# Altium footprint library Apalis Evaluation Board.PcbLib: 212 footprints (part 1 of 14)
Each footprint in its own frame and in the unit in brackets; x right, y up, seen from the top. Pads: shape width x height; smd on the part's side, far side on the other; paste and mask are expansions set on the pad; w line width, h text height; cw(c..) or ccw(c..) is an arc to the next point about the centre after c.
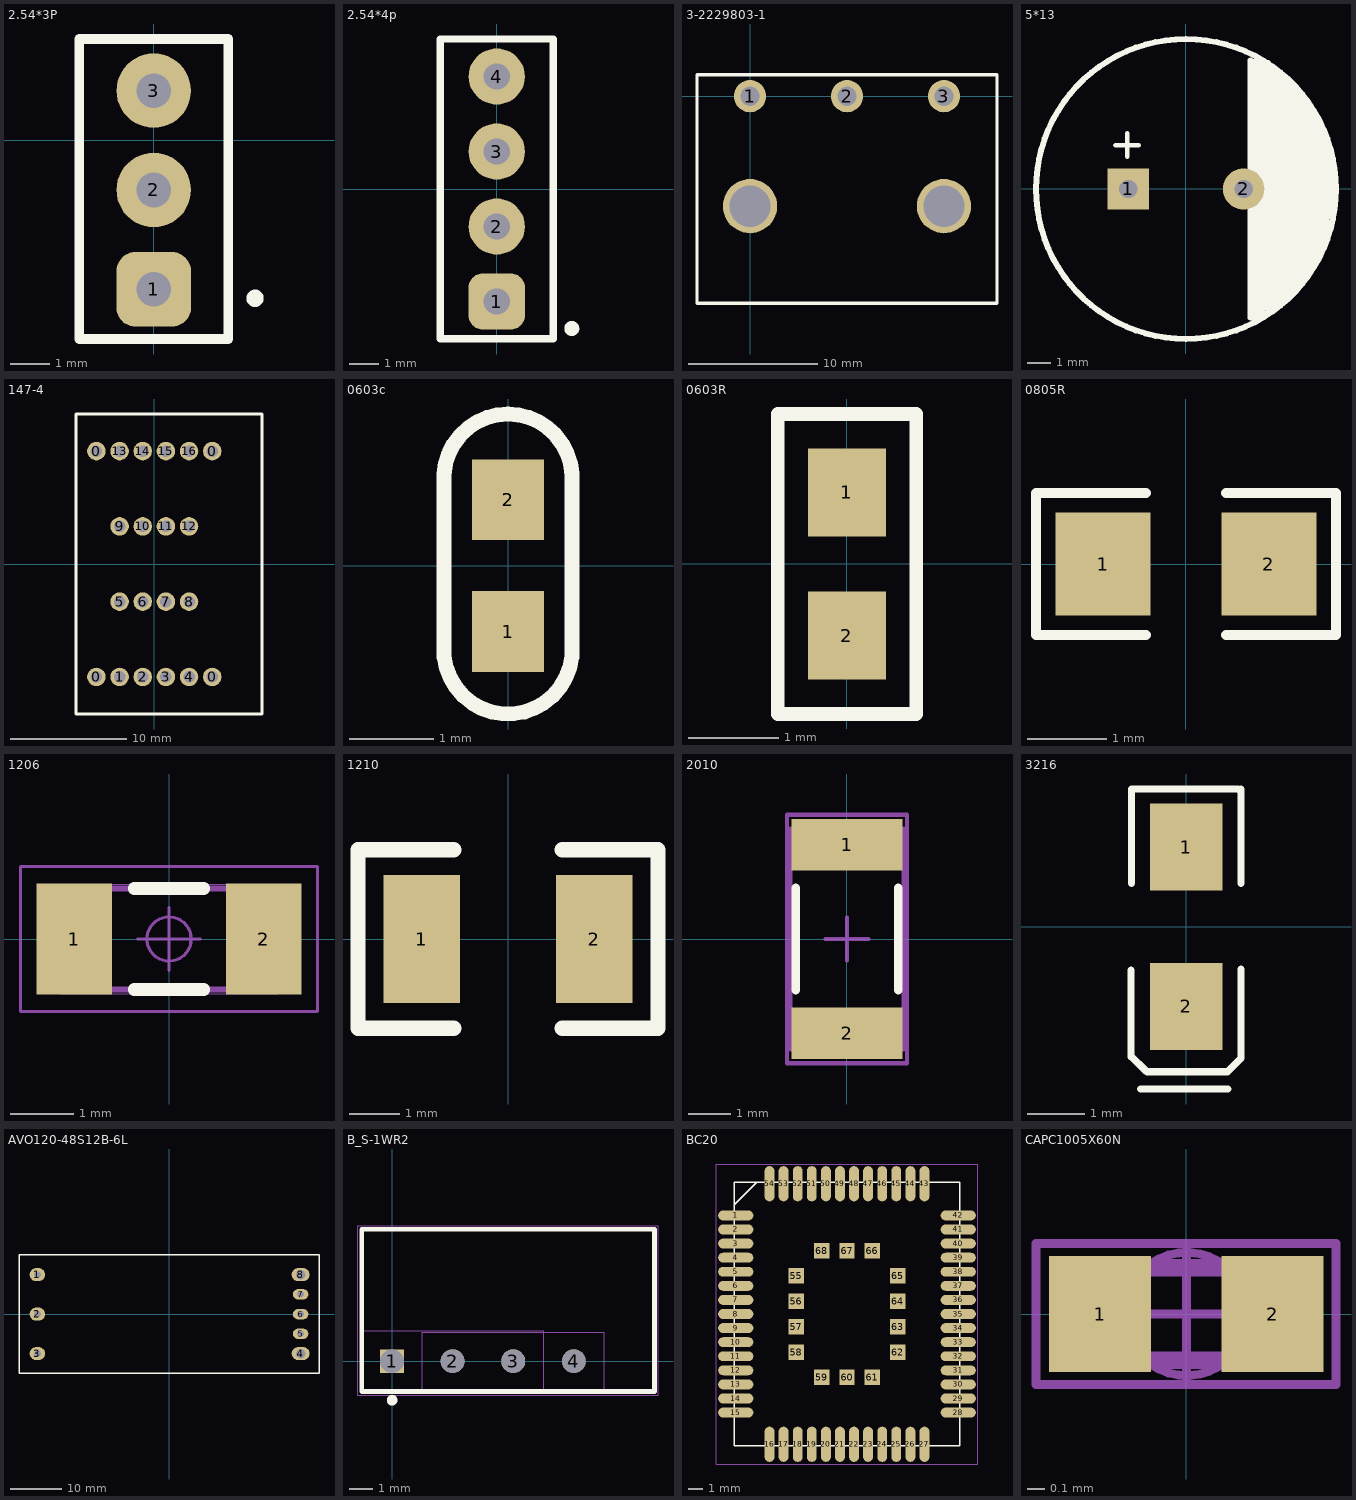
[diagram p0: the footprints below, top view; thin cyan lines are the x and y axes]

## 2.54*3P [mil]
pads (3):
  rrect50% 75x75 hole 35 paste+0: 1(0,-150)
  round 75 hole 35 paste+0: 2(0,-50) 3(0,50)
Top Overlay:
  circle w10: c102,-159 r3.74
  lines w10: -75,-200 -75,102 -37.5,102 37.5,102 75,102 75,-200 -75,-200

## 2.54*4p [mil]
pads (4):
  rrect50% 75x75 hole 35 paste+0: 1(0,-150)
  round 75 hole 35 paste+0: 2(0,-50) 3(0,50) 4(0,150)
Top Overlay:
  circle w10: c100,-186 r5
  lines w10: -75,-200 75,-200 75,200 -75,200 -75,-200

## 3-2229803-1 [mm] "泰科电源端子座"
pads (5):
  round 2.5 hole 1.5: 1(0,0) 2(7.5,0) 3(15,0)
  round 4.2 hole 3.2: ""(0,-8.5) ""(15,-8.5)
Top Overlay:
  lines w0.254: -4.1,-15.998 -4.1,1.651 19.1,1.651 19.1,-16.002 19.098,-16 0,-16 -4.098,-16 -4.1,-15.998

## 5*13 [mm]
pads (2):
  rect 1.8x1.8 hole 0.8: 1(-2.5,0)
  round 1.8 hole 0.8: 2(2.5,0)
Top Overlay:
  circle w0.254: c0,0 r6.51
  lines w0.2: -3.059,1.905 -2.043,1.905 ; -2.551,1.397 -2.551,2.413
  lines w0.254: 3.937,-4.953 3.937,-4.699 3.937,4.953 ; 4.318,-4.826 4.318,4.572 ; 4.318,-4.445 4.699,-4.445 ; 4.572,-4.445 4.572,4.445 ; 4.826,-4.318 4.826,4.191 ; 4.826,-3.81 4.826,-3.683 5.08,-3.429 5.842,-2.667 5.842,-2.54 5.842,2.54 ; 4.953,-3.937 4.953,-3.81 ; 5.08,4.064 5.08,-3.683 ; 5.334,-3.556 5.334,3.556 ; 6.096,-1.778 6.096,1.905 ; 6.096,-1.397 6.096,-1.27 ; 6.096,-1.143 6.096,1.27 ; 6.35,1.397 6.35,-1.016 6.096,-1.27 ; 2.794,-5.588 2.794,5.588 ; 2.794,-5.588 3.048,-5.334 ; 2.794,-5.588 3.048,-5.588 3.175,-5.461 ; 2.794,-5.588 2.921,-5.588 3.048,-5.461 3.175,-5.461 ; 2.794,-5.588 2.921,-5.461 2.794,-5.588 ; 2.794,-5.588 3.048,-5.334 ; 2.794,5.588 3.048,5.334 ; 2.794,5.588 3.048,5.334 ; 2.794,5.588 6.096,2.286 ; 3.048,-5.334 3.048,5.334 ; 3.048,-5.334 3.048,5.588 3.302,5.334 3.302,-5.334 3.175,-5.461 ; 3.048,5.334 3.175,5.461 3.556,5.461 5.334,3.683 ; 3.175,-5.461 3.429,-5.461 3.683,-5.207 3.556,-5.207 3.556,5.334 3.81,5.08 3.81,-5.08 4.191,-4.699 ; 4.191,-4.699 4.191,4.826 4.191,-4.699 ; 4.318,4.572 4.318,4.318 5.588,3.048 ; 4.318,4.572 4.445,4.572 5.334,3.683 ; 4.953,-3.81 5.08,-3.683 ; 4.953,-3.81 4.953,-3.683 5.588,-3.048 ; 5.08,-3.683 5.08,-3.175 6.096,-2.159 6.096,2.286 ; 5.08,-3.683 5.334,-3.429 5.334,-3.302 5.588,-3.048 ; 5.334,3.556 5.334,3.683 ; 5.334,3.556 5.334,3.683 ; 5.588,-3.048 5.588,3.048 ; 5.588,3.048 5.588,2.794 6.096,2.286 ; 6.096,-1.27 6.096,2.286

## 147-4 [mm]
pads (20):
  round 1.6 hole 1: 0(-5,-9.75) 0(-5,9.75) 0(5,-9.75) 0(5,9.75) 1(-3,-9.75) 2(-1,-9.75) 3(1,-9.75) 4(3,-9.75) 5(-3,-3.25) 6(-1,-3.25) 7(1,-3.25) 8(3,-3.25) 9(-3,3.25) 10(-1,3.25) 11(1,3.25) 12(3,3.25) 13(-3,9.75) 14(-1,9.75) 15(1,9.75) 16(3,9.75)
Top Overlay:
  lines w0.254: -6.75,-12.95 7.05,-12.95 ; -6.75,-12.89 -6.75,-11.528 -6.75,12.95 7.05,12.95 9.283,12.95 9.287,12.954 9.287,-12.946 9.283,-12.95 7.033,-12.95 7.05,-12.933

## 0603c [mil]
pads (2):
  rect 34x38 smd: 1(0,-31) 2(0,31)
Top Overlay:
  lines w7: -30,-43.03 ccw(c0,-39.5) 30,-42.97 ; -30,-43 -30,0 ; -30,-5 -30,38 ; -30,37.97 cw(c0,41.13) 30,38.03 ; 30,-43 30,0 ; 30,-5 30,38

## 0603R [mil]
pads (2):
  rect 34x38 smd: 1(0,31) 2(0,-31)
Top Overlay:
  lines w6: -30,-65 -30,0 -30,65 30,65 30,0 30,-65 -30,-65

## 0805R [mm]
pads (2):
  rect 1.2x1.3 smd: 1(-1.05,0) 2(1.05,0)
Top Overlay:
  lines w0.127: -0.508,-0.9 -1.9,-0.9 -1.9,0.9 -0.508,0.9 ; 0.508,-0.9 1.9,-0.9 1.9,0.9 0.508,0.9

## 1206 [mm] "1206R"
height 0.6
pads (2):
  rect 1.2x1.75 smd: 1(-1.5,0) 2(1.5,0)
Top Overlay:
  lines w0.2: -0.55,-0.8 0.55,-0.8 ; -0.55,0.8 0.55,0.8
Mechanical 1:
  circle w0.05: c0,0 r0.35
  lines w0.05: -0.5,0 0.5,0 ; 0,-0.5 0,0.5 ; -2.35,-1.15 -2.35,1.15 2.35,1.15 2.35,-1.15 -2.35,-1.15
Mechanical 2:
  lines w0.001: -1.725,-0.865 -1.725,0.865 1.725,0.865 1.725,-0.865 -1.725,-0.865
Mechanical 3:
  lines w0.1: -1.63,-0.8 -1.63,0.8 1.63,0.8 1.63,-0.8 -1.63,-0.8
3D body: height 0.6, standoff 0, extent -1.725,-0.865 1.725,0.865

## 1210 [mil]
pads (2):
  rect 60x100 smd: 1(-67.5,0) 2(67.5,0)
Top Overlay:
  lines w12: -42.5,-70 -117.5,-70 -117.5,70 -42.5,70 ; 42.5,-70 117.5,-70 117.5,70 42.5,70

## 2010 [mm]
pads (2):
  rect 2.6x1.2 smd: 1(0,2.2) 2(0,-2.2)
Top Overlay:
  lines w0.2: -1.2,-1.2 -1.2,1.2 ; 1.2,-1.2 1.2,1.2
Mechanical 13:
  lines w0.1: -1.325,-2.575 1.325,-2.575 1.325,2.575 -1.325,2.575 -1.325,-2.575
Mechanical 15:
  lines w0.1: -0.5,0 0.5,0 ; 0,-0.5 0,0.5 ; -1.4,-2.9 1.4,-2.9 1.4,2.9 -1.4,2.9 -1.4,-2.9

## 3216 [mil]
pads (2):
  rect 50x60 smd: 1(0,55) 2(0,-55)
Top Overlay:
  lines w5: -38.23,-89.45 -27.95,-99.33 ; -38.19,-89.88 -38.19,-29.88 ; -37.8,29.8 -37.8,95.03 35.8,95.03 37.8,93.03 37.8,88.03 ; -31.47,-111.97 28.53,-111.97 ; -27.16,-100.12 28.35,-100.12 ; 29.13,-99.33 37.8,-90.67 ; 37.8,-89.09 37.8,-29.09 ; 37.8,29.8 37.8,95.03

## AVO120-48S12B-6L [mm]
pads (8):
  oval 3x2.5 hole 1.3: 1(-25.4,7.62) 2(-25.4,0) 3(-25.4,-7.62)
  oval 3.5x2.5 hole 1.8: 4(25.4,-7.62) 8(25.4,7.62)
  oval 3x2 hole 1.3: 5(25.4,-3.81) 6(25.4,0) 7(25.4,3.81)
Top Overlay:
  lines w0.254: -28.95,-11.436 -28.95,7.62 -28.95,11.43 ; -28.934,-11.42 -27.93,-11.42 5.07,-11.42 28.94,-11.42 28.95,-11.41 28.95,7.62 28.95,11.474 28.944,11.48 5.334,11.48 -27.93,11.48 -28.9,11.48

## B_S-1WR2 [mm] "MORNSUN SIP4 11.6x6 Pitch2.54mm"
height 10.16
pads (4):
  rect 1x1 hole 1: 1(0,0)
  round 1 hole 1: 2(2.54,0) 3(5.08,0) 4(7.62,0)
Top Overlay:
  circle w0.254: c0,-1.635 r0.095
  lines w0.2: -1.27,-1.27 -1.27,5.537 10.998,5.537 10.998,-1.27 -1.27,-1.27
Mechanical 1:
  lines w0.05: -1.43,-1.43 -1.43,5.69 11.151,5.69 11.151,-1.43 -1.43,-1.43
Mechanical 2:
  lines w0.001: -1.27,-1.27 6.35,-1.27 6.35,1.27 -1.27,1.27 -1.27,-1.27 ; 1.27,-1.27 1.27,1.219 8.89,1.219 8.89,-1.27 1.27,-1.27
Mechanical 3:
  lines w0.1: -1.27,-1.27 10.998,-1.27 10.998,5.537 -1.27,5.537 -1.27,-1.27

## BC20 [mm] "LCC"
height 2.1
pads (68):
  oval 2.5x0.7 smd mask+0.05: 1(411.454,499.379) 2(411.454,498.379) 3(411.454,497.379) 4(411.454,496.379) 5(411.454,495.379) 6(411.454,494.379) 7(411.454,493.379) 8(411.454,492.379) 9(411.454,491.379) 10(411.454,490.379) 11(411.454,489.379) 12(411.454,488.379) 13(411.454,487.379) 14(411.454,486.379) 15(411.454,485.379) 28(427.254,485.379) 29(427.254,486.379) 30(427.254,487.379) 31(427.254,488.379) 32(427.254,489.379) 33(427.254,490.379) 34(427.254,491.379) 35(427.254,492.379) 36(427.254,493.379) 37(427.254,494.379) 38(427.254,495.379) 39(427.254,496.379) 40(427.254,497.379) 41(427.254,498.379) 42(427.254,499.379)
  oval 0.7x2.5 smd mask+0.05: 16(413.854,483.129) 17(414.854,483.129) 18(415.854,483.129) 19(416.854,483.129) 20(417.854,483.129) 21(418.854,483.129) 22(419.854,483.129) 23(420.854,483.129) 24(421.854,483.129) 25(422.854,483.129) 26(423.854,483.129) 27(424.854,483.129) 43(424.854,501.629) 44(423.854,501.629) 45(422.854,501.629) 46(421.854,501.629) 47(420.854,501.629) 48(419.854,501.629) 49(418.854,501.629) 50(417.854,501.629) 51(416.854,501.629) 52(415.854,501.629) 53(414.854,501.629) 54(413.854,501.629)
  rect 1.1x1.1 smd mask+0.05: 55(415.754,495.079) 56(415.754,493.279) 57(415.754,491.479) 58(415.754,489.679) 59(417.554,487.879) 60(419.354,487.879) 61(421.154,487.879) 62(422.954,489.679) 63(422.954,491.479) 64(422.954,493.279) 65(422.954,495.079) 66(421.154,496.879) 67(419.354,496.879) 68(417.554,496.879)
Top Overlay:
  lines w0.1: 411.354,500.129 412.954,501.729 ; 411.354,483.029 427.354,483.029 427.354,501.729 411.354,501.729 411.354,483.029
Mechanical 1:
  lines w0.01: 410.054,481.729 410.054,503.029 428.654,503.029 428.654,481.729 410.054,481.729

## CAPC1005X60N [mm]
height 0.5
pads (2):
  rect 0.58x0.66 smd: 1(-0.49,0) 2(0.49,0)
Mechanical 1:
  circle w0.05: c0,0 r0.35
  lines w0.05: -0.5,0 0.5,0 ; 0,-0.4 0,0.4 ; -0.855,-0.4 -0.855,0.4 0.85,0.4 0.85,-0.4 -0.855,-0.4
Mechanical 2:
  lines w0.001: -0.55,-0.3 -0.55,0.3 0.55,0.3 0.55,-0.3 -0.55,-0.3
Mechanical 3:
  lines w0.1: -0.512,-0.262 -0.512,0.262 0.512,0.262 0.512,-0.262 -0.512,-0.262
3D body: height 0.5, standoff 0, extent -0.55,-0.3 0.55,0.3